# Altium footprint library common.PcbLib: 552 footprints (part 12 of 35)
Each footprint in its own frame and in the unit in brackets; x right, y up, seen from the top. Pads: shape width x height; smd on the part's side, far side on the other; paste and mask are expansions set on the pad; w line width, h text height; cw(c..) or ccw(c..) is an arc to the next point about the centre after c.
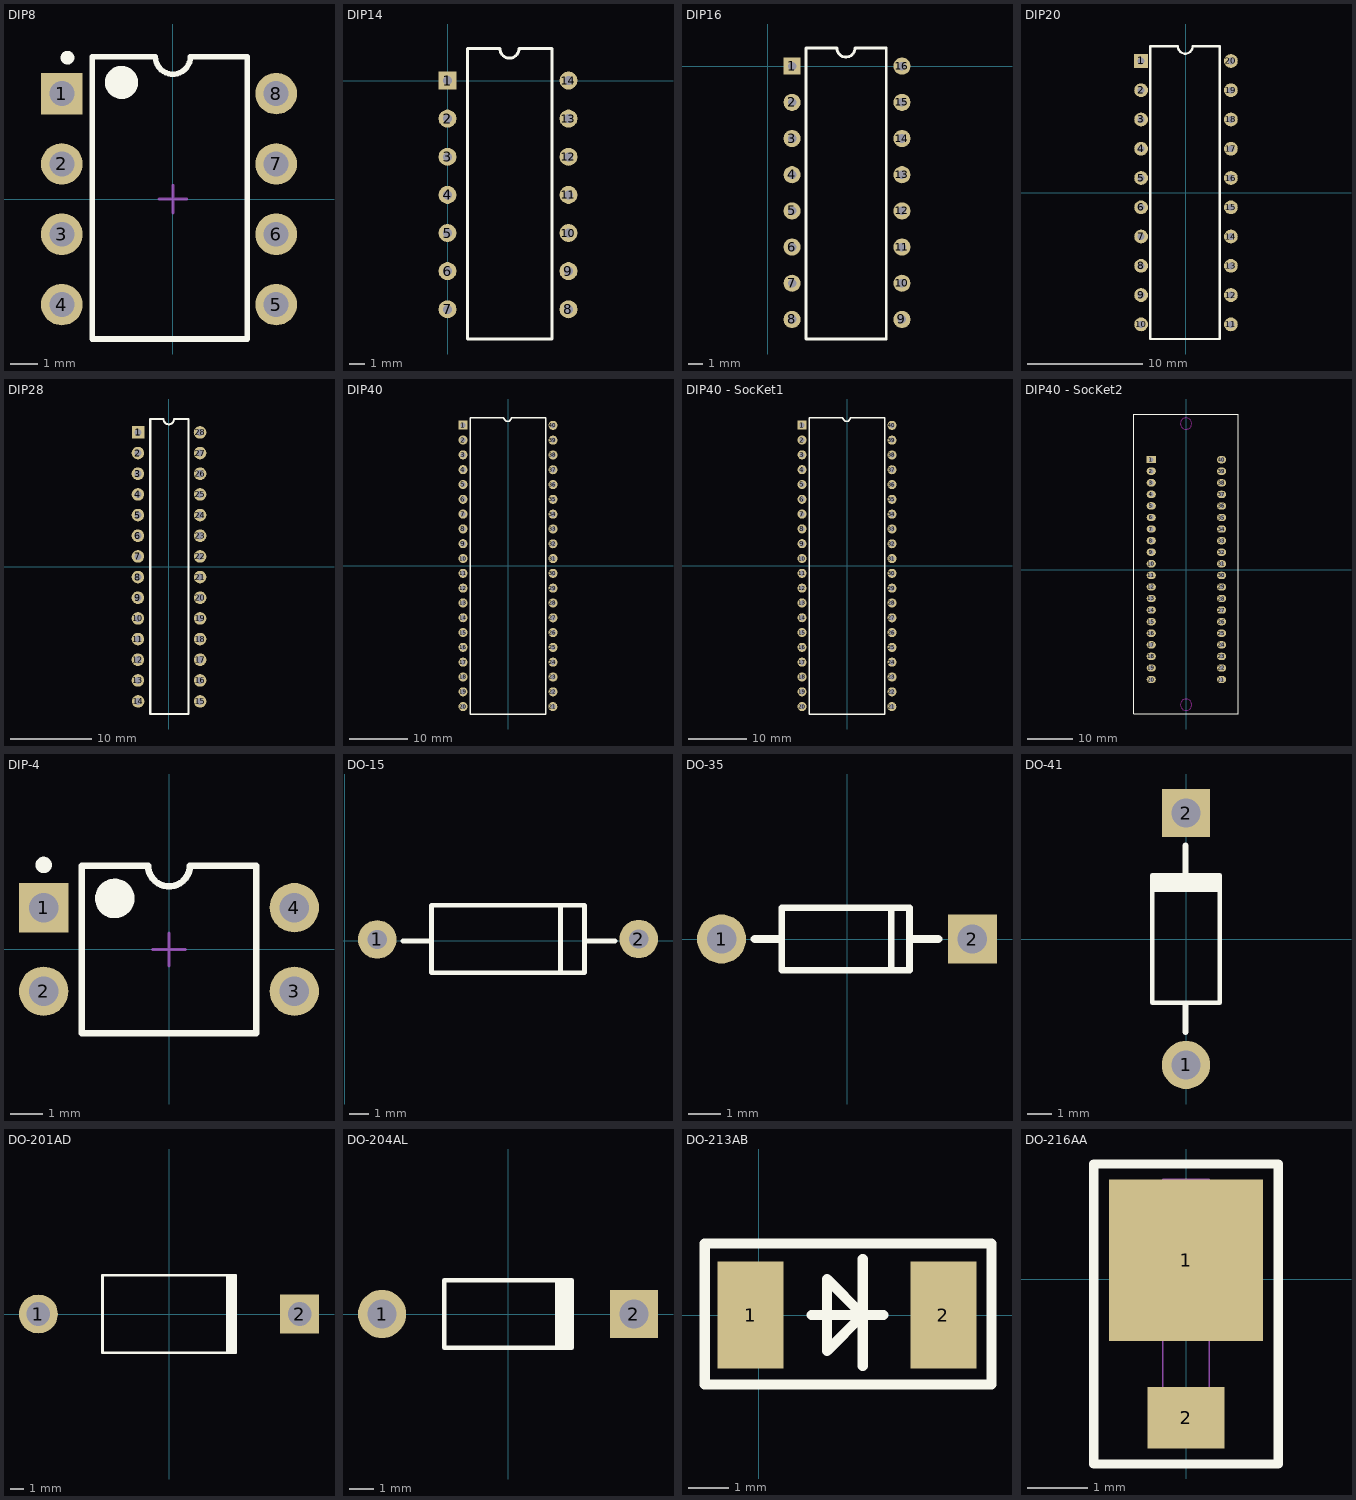
[diagram p11: the footprints below, top view; thin cyan lines are the x and y axes]

## DIP8 [mm]
pads (8):
  rect 1.5x1.5 hole 0.9: 1(-4.013,3.81)
  round 1.5 hole 0.9: 2(-4.013,1.27) 3(-4.013,-1.27) 4(-4.013,-3.81) 5(3.734,-3.81) 6(3.734,-1.27) 7(3.734,1.27) 8(3.734,3.81)
Top Overlay:
  circle w0.6: c-1.854,4.216 r0.3
  circle w0.25: c-3.81,5.11 r0.125
  lines w0.2: -2.921,-5.055 2.692,-5.055 2.692,5.15 0.635,5.15 cw(c0,5.15) -0.635,5.15 -2.921,5.15 -2.921,-5.055
Mechanical 15:
  lines w0.1: -0.5,0 0.5,0 ; 0,-0.5 0,0.5
3D body: height 4.57, standoff -3.81, extent -4.062,-4.879 3.758,5.031

## DIP14 [mm]
pads (14):
  rect 1.2x1.2 hole 0.6: 1(0,0)
  round 1.2 hole 0.6: 2(0,-2.54) 3(0,-5.08) 4(0,-7.62) 5(0,-10.16) 6(0,-12.7) 7(0,-15.24) 8(8.062,-15.24) 9(8.062,-12.7) 10(8.062,-10.16) 11(8.062,-7.62) 12(8.062,-5.08) 13(8.062,-2.54) 14(8.062,0)
Top Overlay:
  lines w0.2: 1.321,-17.221 1.321,2.134 3.493,2.134 ccw(c4.128,2.134) 4.763,2.134 6.96,2.134 6.96,-17.221 1.321,-17.221
3D body: height 4.19, standoff -2.67, extent 0.102,-17.12 7.976,1.93

## DIP16 [mm]
pads (16):
  rect 1.2x1.2 hole 0.6: 1(1.719,0)
  round 1.2 hole 0.6: 2(1.719,-2.54) 3(1.719,-5.08) 4(1.719,-7.62) 5(1.719,-10.16) 6(1.719,-12.7) 7(1.719,-15.24) 8(1.719,-17.78) 9(9.433,-17.78) 10(9.433,-15.24) 11(9.433,-12.7) 12(9.433,-10.16) 13(9.433,-7.62) 14(9.433,-5.08) 15(9.433,-2.54) 16(9.433,0)
Top Overlay:
  lines w0.2: 2.692,-19.152 2.692,1.27 4.865,1.27 ccw(c5.5,1.27) 6.135,1.27 8.331,1.27 8.331,-19.152 2.692,-19.152
3D body: height 5.08, standoff -2.49, extent 1.552,-18.915 9.422,1.084

## DIP20 [mm]
pads (20):
  rect 1.2x1.2 hole 0.6: 1(-3.895,11.43)
  round 1.2 hole 0.6: 2(-3.895,8.89) 3(-3.895,6.35) 4(-3.895,3.81) 5(-3.895,1.27) 6(-3.895,-1.27) 7(-3.895,-3.81) 8(-3.895,-6.35) 9(-3.895,-8.89) 10(-3.895,-11.43) 11(3.895,-11.43) 12(3.895,-8.89) 13(3.895,-6.35) 14(3.895,-3.81) 15(3.895,-1.27) 16(3.895,1.27) 17(3.895,3.81) 18(3.895,6.35) 19(3.895,8.89) 20(3.895,11.43)
Top Overlay:
  lines w0.2: -3.1,-12.7 2.92,-12.7 2.92,12.7 0.572,12.7 cw(c-0.064,12.7) -0.699,12.7 -3.1,12.7 -3.1,-12.7
3D body: height 4.5, standoff -3.5, extent -3.907,-12.622 3.854,12.978

## DIP28 [mil]
pads (28):
  rect 61x61 hole 35: 1(-149.24,650.1)
  round 61 hole 35: 2(-150.36,550.19) 3(-150.36,450.29) 4(-150.36,350.39) 5(-150.36,250.48) 6(-150.36,150.58) 7(-150.36,50.68) 8(-150.36,-49.23) 9(-150.36,-149.13) 10(-150.36,-249.04) 11(-150.36,-348.94) 12(-150.36,-448.84) 13(-150.36,-548.75) 14(-149.24,-650.1) 15(150.36,-650.1) 16(150.36,-548.75) 17(150.36,-448.84) 18(150.36,-348.94) 19(150.36,-249.04) 20(150.36,-149.13) 21(150.36,-49.23) 22(150.36,50.68) 23(150.36,150.58) 24(150.36,250.48) 25(150.36,350.39) 26(150.36,450.29) 27(150.36,550.19) 28(149.97,650.1)
Top Overlay:
  lines w10: -26.21,714.29 -90.63,714.29 -90.63,-711.12 93.87,-711.12 93.87,715.28 24.97,715.28 ; -26.01,714.08 ccw(c-1.01,714.08) 23.99,714.08
3D body: height 200, standoff -98.03, extent -155.54,-708.17 154.31,709.15

## DIP40 [mil]
pads (40):
  rect 61x61 hole 35: 1(-303.88,950.19)
  round 61 hole 35: 2(-303.62,850.17) 3(-303.62,750.15) 4(-303.62,650.13) 5(-303.62,550.11) 6(-303.62,450.09) 7(-303.62,350.07) 8(-303.62,250.05) 9(-303.62,150.03) 10(-303.62,50.01) 11(-303.62,-50.01) 12(-303.62,-150.03) 13(-303.62,-250.05) 14(-303.62,-350.07) 15(-303.62,-450.09) 16(-303.62,-550.11) 17(-303.62,-650.13) 18(-303.62,-750.15) 19(-303.62,-850.17) 20(-303.62,-950.19) 21(303.04,-950.19) 22(303.88,-850.21) 23(303.88,-750.23) 24(303.88,-650.25) 25(303.88,-550.28) 26(303.88,-450.3) 27(303.88,-350.32) 28(303.88,-250.34) 29(303.88,-150.36) 30(303.88,-50.39) 31(303.88,49.59) 32(303.88,149.57) 33(303.88,249.55) 34(303.88,349.53) 35(303.88,449.5) 36(303.88,549.48) 37(303.88,649.46) 38(303.88,749.44) 39(303.88,849.42) 40(303.88,949.39)
Top Overlay:
  lines w10: -254.04,-1000.19 253.88,-1000.19 253.88,1001.06 21.79,1001.06 cw(c-3.21,1001.06) -28.21,1001.06 -254.04,1001.06 -254.04,-1000.19
3D body: height 224.41, standoff -101.57, extent -303.72,-1026.29 306.12,1038.67

## DIP40 - SocKet1 [mil]
pads (40):
  rect 61x61 hole 35: 1(-303.88,950.19)
  round 61 hole 35: 2(-303.62,850.17) 3(-303.62,750.15) 4(-303.62,650.13) 5(-303.62,550.11) 6(-303.62,450.09) 7(-303.62,350.07) 8(-303.62,250.05) 9(-303.62,150.03) 10(-303.62,50.01) 11(-303.62,-50.01) 12(-303.62,-150.03) 13(-303.62,-250.05) 14(-303.62,-350.07) 15(-303.62,-450.09) 16(-303.62,-550.11) 17(-303.62,-650.13) 18(-303.62,-750.15) 19(-303.62,-850.17) 20(-303.62,-950.19) 21(303.04,-950.19) 22(303.88,-850.21) 23(303.88,-750.23) 24(303.88,-650.25) 25(303.88,-550.28) 26(303.88,-450.3) 27(303.88,-350.32) 28(303.88,-250.34) 29(303.88,-150.36) 30(303.88,-50.39) 31(303.88,49.59) 32(303.88,149.57) 33(303.88,249.55) 34(303.88,349.53) 35(303.88,449.5) 36(303.88,549.48) 37(303.88,649.46) 38(303.88,749.44) 39(303.88,849.42) 40(303.88,949.39)
Top Overlay:
  lines w10: -254.04,-1000.19 -254.04,1001.06 -28.21,1001.06 ccw(c-3.21,1001.06) 21.79,1001.06 253.88,1001.06 253.88,-1000.19 -254.04,-1000.19
3D body: height 188.98, standoff -137.8, extent -347.46,-999.03 345.46,997.03

## DIP40 - SocKet2 [mm]
pads (40):
  rect 2x1.6 hole 1: 1(-7.718,24.135)
  oval 2x1.6 hole 1: 2(-7.712,21.594) 3(-7.712,19.054) 4(-7.712,16.513) 5(-7.712,13.973) 6(-7.712,11.432) 7(-7.712,8.892) 8(-7.712,6.351) 9(-7.712,3.811) 10(-7.712,1.27) 11(-7.712,-1.27) 12(-7.712,-3.811) 13(-7.712,-6.351) 14(-7.712,-8.892) 15(-7.712,-11.432) 16(-7.712,-13.973) 17(-7.712,-16.513) 18(-7.712,-19.054) 19(-7.712,-21.594) 20(-7.712,-24.135) 21(7.697,-24.135) 22(7.718,-21.595) 23(7.718,-19.056) 24(7.718,-16.516) 25(7.718,-13.977) 26(7.718,-11.438) 27(7.718,-8.898) 28(7.718,-6.359) 29(7.718,-3.819) 30(7.718,-1.28) 31(7.718,1.26) 32(7.718,3.799) 33(7.718,6.339) 34(7.718,8.878) 35(7.718,11.417) 36(7.718,13.957) 37(7.718,16.496) 38(7.718,19.036) 39(7.718,21.575) 40(7.718,24.115)
Top Overlay:
  lines w0.254: -11.557,-31.699 -11.557,34.137 11.379,34.137 11.379,-31.699 -11.557,-31.699
Keep-Out Layer:
  circle w0.254: c-0.076,-29.667 r1.25
  circle w0.254: c-0.076,32.029 r1.25
3D body: height 22.37, standoff -2.13, extent -13.076,-31.554 11.399,41.526

## DIP-4 [mm] "光耦（未加焊）"
height 5.6
pads (4):
  rect 1.5x1.5 hole 0.9: 1(-3.81,1.27)
  round 1.5 hole 0.9: 2(-3.81,-1.27) 3(3.81,-1.27) 4(3.81,1.27)
Top Overlay:
  circle w0.25: c-3.81,2.57 r0.125
  circle w0.6: c-1.65,1.55 r0.3
  lines w0.2: -2.65,-2.55 -2.65,2.55 -0.635,2.55 ccw(c0,2.55) 0.635,2.55 2.65,2.55 2.65,-2.55 -2.65,-2.55
Mechanical 15:
  lines w0.1: -0.5,0 0.5,0 ; 0,-0.5 0,0.5
3D body: height 4.78, standoff -3, extent -3.915,-2.25 3.925,2.27

## DO-15 [mm] "DO-15"
pads (2):
  round 2 hole 1: 1(1.676,0.076) 2(15.265,0.102)
Top Overlay:
  lines w0.254: 3.023,0 4.445,0 ; 11.201,-1.651 11.201,1.854 ; 11.709,-1.651 11.735,-1.651 ; 12.522,0 14.046,0 ; 4.496,-1.651 4.496,1.854 12.446,1.854 12.446,-1.651 4.496,-1.651
3D body: height 4.78, standoff -1, extent 1.245,-1.676 15.705,1.889

## DO-35 [mm] "DO-204AH"
pads (2):
  round 1.5 hole 0.9: 1(-3.835,0)
  rect 1.5x1.5 hole 0.9: 2(3.835,0)
Top Overlay:
  lines w0.2: 1.352,-0.95 1.352,0.95 ; 1.899,-0.95 -2.001,-0.95 -2.001,0.95 1.899,0.95 ; 1.911,-0.95 1.911,0.95
  lines w0.254: -2.819,0 -2.026,0 ; 1.956,0 2.794,0
3D body: height 3.33, standoff -1, extent -4.216,-1.321 4.191,1.346

## DO-41 [mm]
pads (2):
  round 2 hole 1.2: 1(0,-5.23)
  rect 2x2 hole 1.2: 2(0,5.23)
Top Overlay:
  region: 1.4,1.95 1.4,2.75 -1.4,2.75 -1.4,1.95
  lines w0.2: -1.4,2.65 -1.4,-2.65 1.4,-2.65 1.4,2.65
  lines w0.254: -0.025,-3.858 -0.025,-2.69 ; -0.025,2.466 -0.025,3.889
3D body: height 3.3, standoff -2, extent -1.279,-5.599 1.321,5.461

## DO-201AD [mm] "Diode, Axial; Body 9.5 x 5.6 mm (LxDia. max), Lead Dia. 1.32 mm (max)"
height 5.6
pads (2):
  round 2.8 hole 1.7: 1(-9.42,0)
  rect 2.8x2.8 hole 1.7: 2(9.42,0)
Top Overlay:
  rectangle: 4.1,-2.8 4.9,2.8
  lines w0.2: 4.8,-2.8 -4.8,-2.8 -4.8,2.8 4.8,2.8
3D body: height 4.51, standoff -1, extent -9.754,-2.505 9.746,2.515

## DO-204AL [mm] "Diode, Axial; Body 5.2 x 2.7 mm (LxDia. max), Lead Dia. 0.86 mm (max)"
height 2.7
pads (2):
  round 2 hole 1.2: 1(-5.23,0)
  rect 2x2 hole 1.2: 2(5.23,0)
Top Overlay:
  rectangle: 1.95,-1.4 2.75,1.4
  lines w0.2: 2.65,-1.4 -2.65,-1.4 -2.65,1.4 2.65,1.4
3D body: height 3.51, standoff -1, extent -5.542,-1.521 5.588,1.499

## DO-213AB [mil] "LL4150X25MM"
pads (2):
  rect 65x105 smd: 1(-8,0) 2(181,0)
Top Overlay:
  lines w10: 52,0 122,0 ; 102,-50 102,55 ; -53,-68 228,-68 228,70 -53,70 -53,-68 ; 67,-35 102,0 67,35 67,-35
3D body: height 103.74, standoff -1.38, extent -17.36,-52.12 187.36,53

## DO-216AA [mil]
pads (2):
  rect 100x105 smd mask+3: 1(0,12.5)
  rect 50x40 smd mask+3: 2(0,-90)
Top Overlay:
  lines w6: -60,-120 -60,75 60,75 60,-120 -60,-120
Mechanical 1:
  lines w1: -40,-35 -40,50 -15,50 -15,65 15,65 15,50 40,50 40,-35 15,-35 15,-95 -15,-95 -15,-35 -40,-35
  text "A:D1" at -6.18,38.64 h25
3D body: height 40.24, standoff 0, extent -38.19,-93.7 37.01,54.33